# Altium footprint library Connector_art.PcbLib: 209 footprints (part 6 of 14)
Each footprint in its own frame and in the unit in brackets; x right, y up, seen from the top. Pads: shape width x height; smd on the part's side, far side on the other; paste and mask are expansions set on the pad; w line width, h text height; cw(c..) or ccw(c..) is an arc to the next point about the centre after c.
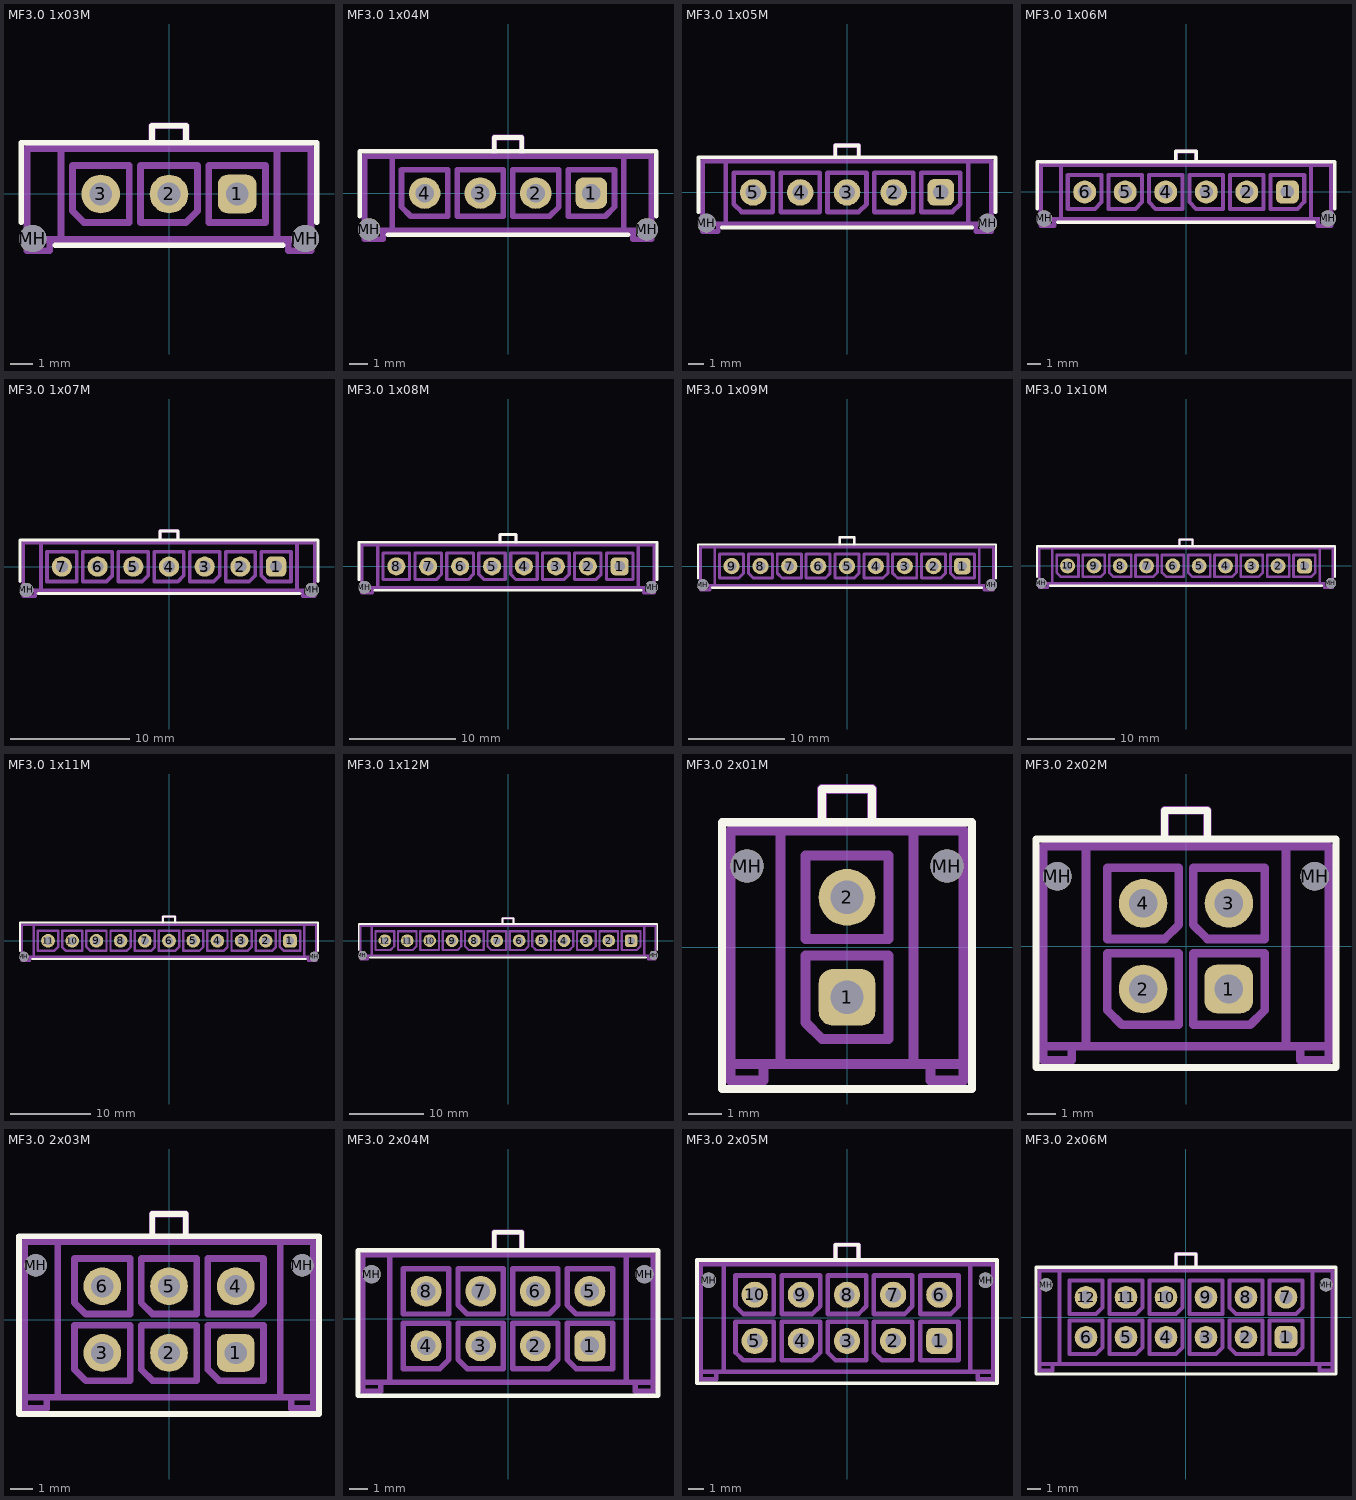
[diagram p5: the footprints below, top view; thin cyan lines are the x and y axes]

## MF3.0 1x03M [mm]
height 9.91
pads (5):
  rrect50% 1.7x1.7 hole 1 paste+0: 1(3,0)
  round 1.7 hole 1: 2(0,0) 3(-3,0)
  round 1.2 hole 1.2 unplated: MH(-6,-1.96) MH(6,-1.96)
Top Overlay:
  lines w0.25: -6.5,-1.25 -6.5,2.25 6.5,2.25 6.5,-1.25 ; -5,-2.25 5,-2.25 ; -0.75,2.25 -0.75,3 0.75,3 0.75,2.25
Mechanical 1:
  lines w0.3: -5.25,-2 -5.25,-2.5 -6.25,-2.5 ; -0.75,2 -0.75,3 0.75,3 0.75,2 ; 5.25,-2 5.25,-2.5 6.25,-2.5 ; -6.25,-2.5 -6.25,-2 -4.75,-2 ; -6.25,-2.5 -6.25,2 -4.75,2 ; -4.75,-2 4.75,-2 ; -4.75,-2 -4.75,2 ; -4.75,2 4.75,2 ; 4.75,-2 6.25,-2 6.25,-2.5 ; 4.75,-2 4.75,2 ; 4.75,2 6.25,2 6.25,-2.5 ; -4.25,-0.75 -3.75,-1.25 -1.75,-1.25 -1.75,1.25 -4.25,1.25 -4.25,-0.75 ; -1.25,-1.25 -1.25,1.25 1.25,1.25 1.25,-0.75 0.75,-1.25 -1.25,-1.25 ; 1.75,-1.25 1.75,1.25 4.25,1.25 4.25,-1.25 1.75,-1.25
3D body: height 9.91, standoff -3.17, extent -6.325,-2.47 6.325,3.1

## MF3.0 1x04M [mm]
height 9.91
pads (6):
  rrect50% 1.7x1.7 hole 1 paste+0: 1(4.5,0)
  round 1.7 hole 1: 2(1.5,0) 3(-1.5,0) 4(-4.5,0)
  round 1.2 hole 1.2 unplated: MH(-7.5,-1.96) MH(7.5,-1.96)
Top Overlay:
  lines w0.25: -8,-1.25 -8,2.25 8,2.25 8,-1.25 ; -6.5,-2.25 6.5,-2.25 ; -0.75,2.25 -0.75,3 0.75,3 0.75,2.25
Mechanical 1:
  lines w0.3: -6.75,-2 -6.75,-2.5 -7.75,-2.5 ; -0.75,2 -0.75,3 0.75,3 0.75,2 ; 6.75,-2 6.75,-2.5 7.75,-2.5 ; -7.75,-2.5 -7.75,-2 -6.25,-2 ; -7.75,-2.5 -7.75,2 -6.25,2 ; -6.25,-2 6.25,-2 ; -6.25,-2 -6.25,2 ; -6.25,2 6.25,2 ; 6.25,-2 7.75,-2 7.75,-2.5 ; 6.25,-2 6.25,2 ; 6.25,2 7.75,2 7.75,-2.5 ; -5.75,-0.75 -5.75,1.25 -3.25,1.25 -3.25,-1.25 -5.25,-1.25 -5.75,-0.75 ; -2.75,-1.25 -2.75,1.25 -0.25,1.25 -0.25,-1.25 -2.75,-1.25 ; 0.25,-1.25 2.25,-1.25 2.75,-0.75 2.75,1.25 0.25,1.25 0.25,-1.25 ; 3.25,-1.25 5.25,-1.25 5.75,-0.75 5.75,1.25 3.25,1.25 3.25,-1.25
3D body: height 9.91, standoff -3.17, extent -7.825,-2.47 7.825,3.1

## MF3.0 1x05M [mm]
height 9.91
pads (7):
  rrect50% 1.7x1.7 hole 1 paste+0: 1(6,0)
  round 1.7 hole 1: 2(3,0) 3(0,0) 4(-3,0) 5(-6,0)
  round 1.2 hole 1.2 unplated: MH(-9,-1.96) MH(9,-1.96)
Top Overlay:
  lines w0.25: -9.5,-1.25 -9.5,2.25 9.5,2.25 9.5,-1.25 ; -8,-2.25 8,-2.25 ; -0.75,2.25 -0.75,3 0.75,3 0.75,2.25
Mechanical 1:
  lines w0.3: -8.25,-2 -8.25,-2.5 -9.25,-2.5 ; -0.75,2 -0.75,3 0.75,3 0.75,2 ; 8.25,-2 8.25,-2.5 9.25,-2.5 ; -9.25,-2.5 -9.25,2 -7.75,2 ; -9.25,-2.5 -9.25,-2 -7.75,-2 ; -7.75,-2 -7.75,2 ; -7.75,-2 7.75,-2 ; -7.75,2 7.75,2 ; 7.75,-2 7.75,2 ; 7.75,-2 9.25,-2 9.25,-2.5 ; 7.75,2 9.25,2 9.25,-2.5 ; -7.25,-0.75 -6.75,-1.25 -4.75,-1.25 -4.75,1.25 -7.25,1.25 -7.25,-0.75 ; -4.25,-1.25 -4.25,1.25 -1.75,1.25 -1.75,-1.25 -4.25,-1.25 ; -1.25,-1.25 -1.25,1.25 1.25,1.25 1.25,-0.75 0.75,-1.25 -1.25,-1.25 ; 1.75,-1.25 1.75,1.25 4.25,1.25 4.25,-1.25 1.75,-1.25 ; 4.75,-1.25 4.75,1.25 7.25,1.25 7.25,-0.75 6.75,-1.25 4.75,-1.25
3D body: height 9.91, standoff -3.17, extent -9.32,-2.47 9.32,3.1

## MF3.0 1x06M [mm]
height 9.91
pads (8):
  rrect50% 1.7x1.7 hole 1 paste+0: 1(7.5,0)
  round 1.7 hole 1: 2(4.5,0) 3(1.5,0) 4(-1.5,0) 5(-4.5,0) 6(-7.5,0)
  round 1.2 hole 1.2 unplated: MH(-10.5,-1.96) MH(10.5,-1.96)
Top Overlay:
  lines w0.25: -11,-1.25 -11,2.25 11,2.25 11,-1.25 ; -9.5,-2.25 9.5,-2.25 ; -0.75,2.25 -0.75,3 0.75,3 0.75,2.25
Mechanical 1:
  lines w0.3: -9.75,-2 -9.75,-2.5 -10.75,-2.5 ; -0.75,2 -0.75,3 0.75,3 0.75,2 ; 9.75,-2 9.75,-2.5 10.75,-2.5 ; -10.75,-2.5 -10.75,-2 -9.25,-2 ; -10.75,-2.5 -10.75,2 -9.25,2 ; -9.25,-2 9.25,-2 ; -9.25,-2 -9.25,2 ; -9.25,2 9.25,2 ; 6.25,-1.25 6.25,1.25 8.75,1.25 8.75,-0.75 8.25,-1.25 6.25,-1.25 ; 6.25,-1.25 6.25,-1.25 ; 9.25,-2 10.75,-2 10.75,-2.5 ; 9.25,-2 9.25,2 ; 9.25,2 10.75,2 10.75,-2.5 ; -8.75,-1.25 -8.75,1.25 -6.25,1.25 -6.25,-0.75 -6.75,-1.25 -8.75,-1.25 ; -5.75,-1.25 -5.75,1.25 -3.25,1.25 -3.25,-0.75 -3.75,-1.25 -5.75,-1.25 ; -2.75,-0.75 -2.25,-1.25 -0.25,-1.25 -0.25,1.25 -2.75,1.25 -2.75,-0.75 ; 0.25,-0.75 0.75,-1.25 2.75,-1.25 2.75,1.25 0.25,1.25 0.25,-0.75 ; 3.25,-1.25 5.75,-1.25 5.75,1.25 3.25,1.25 3.25,-1.25
3D body: height 9.91, standoff -3.17, extent -10.82,-2.47 10.82,3.1

## MF3.0 1x07M [mm]
height 9.91
pads (9):
  rrect50% 1.7x1.7 hole 1 paste+0: 1(9,0)
  round 1.7 hole 1: 2(6,0) 3(3,0) 4(0,0) 5(-3,0) 6(-6,0) 7(-9,0)
  round 1.2 hole 1.2 unplated: MH(-12,-1.96) MH(12,-1.96)
Top Overlay:
  lines w0.25: -12.5,-1.25 -12.5,2.25 12.5,2.25 12.5,-1.25 ; -11,-2.25 11,-2.25 ; -0.75,2.25 -0.75,3 0.75,3 0.75,2.25
Mechanical 1:
  lines w0.3: -11.25,-2 -11.25,-2.5 -12.25,-2.5 ; -0.75,2 -0.75,3 0.75,3 0.75,2 ; 11.25,-2 11.25,-2.5 12.25,-2.5 ; -12.25,-2.5 -12.25,-2 -10.75,-2 ; -12.25,-2.5 -12.25,2 -10.75,2 ; -10.75,-2 10.75,-2 ; -10.75,-2 -10.75,2 ; -10.75,2 10.75,2 ; 10.75,-2 12.25,-2 12.25,-2.5 ; 10.75,-2 10.75,2 ; 10.75,2 12.25,2 12.25,-2.5 ; -10.25,-1.25 -10.25,1.25 -7.75,1.25 -7.75,-1.25 -10.25,-1.25 ; -7.25,-1.25 -7.25,1.25 -4.75,1.25 -4.75,-0.75 -5.25,-1.25 -7.25,-1.25 ; -4.25,-1.25 -4.25,1.25 -1.75,1.25 -1.75,-0.75 -2.25,-1.25 -4.25,-1.25 ; -1.25,-1.25 -1.25,1.25 1.25,1.25 1.25,-0.75 0.75,-1.25 -1.25,-1.25 ; 1.75,-1.25 1.75,1.25 4.25,1.25 4.25,-0.75 3.75,-1.25 1.75,-1.25 ; 4.75,-1.25 4.75,1.25 7.25,1.25 7.25,-0.75 6.75,-1.25 4.75,-1.25 ; 7.75,-0.75 7.75,1.25 10.25,1.25 10.25,-1.25 8.25,-1.25 7.75,-0.75
3D body: height 9.91, standoff -3.17, extent -12.32,-2.47 12.32,3.1

## MF3.0 1x08M [mm]
height 9.91
pads (10):
  rrect50% 1.7x1.7 hole 1 paste+0: 1(10.5,0)
  round 1.7 hole 1: 2(7.5,0) 3(4.5,0) 4(1.5,0) 5(-1.5,0) 6(-4.5,0) 7(-7.5,0) 8(-10.5,0)
  round 1.2 hole 1.2 unplated: MH(-13.5,-1.96) MH(13.5,-1.96)
Top Overlay:
  lines w0.25: -14,-1.25 -14,2.25 14,2.25 14,-1.25 ; -12.5,-2.25 12.5,-2.25 ; -0.75,2.25 -0.75,3 0.75,3 0.75,2.25
Mechanical 1:
  lines w0.3: -12.75,-2 -12.75,-2.5 -13.75,-2.5 ; -0.75,2 -0.75,3 0.75,3 0.75,2 ; 12.75,-2 12.75,-2.5 13.75,-2.5 ; -13.75,-2.5 -13.75,-2 -12.25,-2 ; -13.75,-2.5 -13.75,2 -12.25,2 ; -12.25,-2 12.25,-2 ; -12.25,-2 -12.25,2 ; -12.25,2 12.25,2 ; 12.25,-2 13.75,-2 13.75,-2.5 ; 12.25,-2 12.25,2 ; 12.25,2 13.75,2 13.75,-2.5 ; -11.75,-1.25 -11.75,1.25 -9.25,1.25 -9.25,-1.25 -11.75,-1.25 ; -8.75,-1.25 -6.75,-1.25 -6.25,-0.75 -6.25,1.25 -8.75,1.25 -8.75,-1.25 ; -5.75,-1.25 -3.75,-1.25 -3.25,-0.75 -3.25,1.25 -5.75,1.25 -5.75,-1.25 ; -2.75,-0.75 -2.75,1.25 -0.25,1.25 -0.25,-1.25 -2.25,-1.25 -2.75,-0.75 ; 0.25,-0.75 0.25,1.25 2.75,1.25 2.75,-1.25 0.75,-1.25 0.25,-0.75 ; 3.25,-1.25 5.25,-1.25 5.75,-0.75 5.75,1.25 3.25,1.25 3.25,-1.25 ; 6.25,-1.25 8.25,-1.25 8.75,-0.75 8.75,1.25 6.25,1.25 6.25,-1.25 ; 9.25,-1.25 9.25,1.25 11.75,1.25 11.75,-1.25 9.25,-1.25
3D body: height 9.91, standoff -3.17, extent -13.82,-2.47 13.82,3.1

## MF3.0 1x09M [mm]
height 9.91
pads (11):
  rrect50% 1.7x1.7 hole 1 paste+0: 1(12,0)
  round 1.7 hole 1: 2(9,0) 3(6,0) 4(3,0) 5(0,0) 6(-3,0) 7(-6,0) 8(-9,0) 9(-12,0)
  round 1.2 hole 1.2 unplated: MH(-15,-1.96) MH(15,-1.96)
Top Overlay:
  lines w0.25: -15.5,-1.25 -15.5,2.25 15.5,2.25 15.5,-1.25 ; -14,-2.25 14,-2.25 ; -0.75,2.25 -0.75,3 0.75,3 0.75,2.25
Mechanical 1:
  lines w0.3: -14.25,-2 -14.25,-2.5 -15.25,-2.5 ; -0.75,2 -0.75,3 0.75,3 0.75,2 ; 14.25,-2 14.25,-2.5 15.25,-2.5 ; -15.25,-2.5 -15.25,2 -13.75,2 ; -15.25,-2.5 -15.25,-2 -13.75,-2 ; -13.75,-2 -13.75,2 ; -13.75,-2 13.75,-2 ; -13.75,2 13.75,2 ; 13.75,-2 13.75,2 ; 13.75,-2 15.25,-2 15.25,-2.5 ; 13.75,2 15.25,2 15.25,-2.5 ; -13.25,-1.25 -11.25,-1.25 -10.75,-0.75 -10.75,1.25 -13.25,1.25 -13.25,-1.25 ; -10.25,-0.75 -10.25,1.25 -7.75,1.25 -7.75,-1.25 -9.75,-1.25 -10.25,-0.75 ; -7.25,-0.75 -7.25,1.25 -4.75,1.25 -4.75,-1.25 -6.75,-1.25 -7.25,-0.75 ; -4.25,-1.25 -2.25,-1.25 -1.75,-0.75 -1.75,1.25 -4.25,1.25 -4.25,-1.25 ; -1.25,-1.25 0.75,-1.25 1.25,-0.75 1.25,1.25 -1.25,1.25 -1.25,-1.25 ; 1.75,-1.25 3.75,-1.25 4.25,-0.75 4.25,1.25 1.75,1.25 1.75,-1.25 ; 4.75,-0.75 4.75,1.25 7.25,1.25 7.25,-1.25 5.25,-1.25 4.75,-0.75 ; 7.75,-1.25 9.75,-1.25 10.25,-0.75 10.25,1.25 7.75,1.25 7.75,-1.25 ; 10.75,-0.75 11.25,-1.25 13.25,-1.25 13.25,1.25 10.75,1.25 10.75,-0.75
3D body: height 9.91, standoff -3.17, extent -15.315,-2.47 15.315,3.1

## MF3.0 1x10M [mm]
height 9.91
pads (12):
  rrect50% 1.7x1.7 hole 1 paste+0: 1(13.5,0)
  round 1.7 hole 1: 2(10.5,0) 3(7.5,0) 4(4.5,0) 5(1.5,0) 6(-1.5,0) 7(-4.5,0) 8(-7.5,0) 9(-10.5,0) 10(-13.5,0)
  round 1.2 hole 1.2 unplated: MH(-16.5,-1.96) MH(16.5,-1.96)
Top Overlay:
  lines w0.25: -17,-1.25 -17,2.25 17,2.25 17,-1.25 ; -15.5,-2.25 15.5,-2.25 ; -0.75,2.25 -0.75,3 0.75,3 0.75,2.25
Mechanical 1:
  lines w0.3: -15.75,-2 -15.75,-2.5 -16.75,-2.5 ; -0.75,2 -0.75,3 0.75,3 0.75,2 ; 15.75,-2 15.75,-2.5 16.75,-2.5 ; -16.75,-2.5 -16.75,2 -15.25,2 ; -16.75,-2.5 -16.75,-2 -15.25,-2 ; -15.25,-2 -15.25,2 ; -15.25,-2 15.25,-2 ; -15.25,2 15.25,2 ; 15.25,-2 15.25,2 ; 15.25,-2 16.75,-2 16.75,-2.5 ; 15.25,2 16.75,2 16.75,-2.5 ; -14.75,-0.75 -14.25,-1.25 -12.25,-1.25 -12.25,1.25 -14.75,1.25 -14.75,-0.75 ; -11.75,-1.25 -11.75,1.25 -9.25,1.25 -9.25,-0.75 -9.75,-1.25 -11.75,-1.25 ; -8.75,-0.75 -8.25,-1.25 -6.25,-1.25 -6.25,1.25 -8.75,1.25 -8.75,-0.75 ; -5.75,-1.25 -5.75,1.25 -3.25,1.25 -3.25,-0.75 -3.75,-1.25 -5.75,-1.25 ; -2.75,-0.75 -2.25,-1.25 -0.25,-1.25 -0.25,1.25 -2.75,1.25 -2.75,-0.75 ; 0.25,-0.75 0.75,-1.25 2.75,-1.25 2.75,1.25 0.25,1.25 0.25,-0.75 ; 3.25,-1.25 3.25,1.25 5.75,1.25 5.75,-0.75 5.25,-1.25 3.25,-1.25 ; 6.25,-1.25 6.25,1.25 8.75,1.25 8.75,-0.75 8.25,-1.25 6.25,-1.25 ; 9.25,-1.25 9.25,1.25 11.75,1.25 11.75,-1.25 9.25,-1.25 ; 12.25,-1.25 12.25,1.25 14.75,1.25 14.75,-0.75 14.25,-1.25 12.25,-1.25
3D body: height 9.91, standoff -3.17, extent -16.83,-2.47 16.83,3.1

## MF3.0 1x11M [mm]
height 9.91
pads (13):
  rrect50% 1.7x1.7 hole 1 paste+0: 1(15,0)
  round 1.7 hole 1: 2(12,0) 3(9,0) 4(6,0) 5(3,0) 6(0,0) 7(-3,0) 8(-6,0) 9(-9,0) 10(-12,0) 11(-15,0)
  round 1.2 hole 1.2 unplated: MH(-18,-1.96) MH(18,-1.96)
Top Overlay:
  lines w0.25: -18.5,-1.25 -18.5,2.25 18.5,2.25 18.5,-1.25 ; -17,-2.25 17,-2.25 ; -0.75,2.25 -0.75,3 0.75,3 0.75,2.25
Mechanical 1:
  lines w0.3: -17.25,-2 -17.25,-2.5 -18.25,-2.5 ; -0.75,2 -0.75,3 0.75,3 0.75,2 ; 17.25,-2 17.25,-2.5 18.25,-2.5 ; -18.25,-2.5 -18.25,-2 -16.75,-2 ; -18.25,-2.5 -18.25,2 -16.75,2 ; -16.75,-2 16.75,-2 ; -16.75,-2 -16.75,2 ; -16.75,2 16.75,2 ; 16.75,-2 18.25,-2 18.25,-2.5 ; 16.75,-2 16.75,2 ; 16.75,2 18.25,2 18.25,-2.5 ; -16.25,-1.25 -16.25,1.25 -13.75,1.25 -13.75,-0.75 -14.25,-1.25 -16.25,-1.25 ; -13.25,-0.75 -12.75,-1.25 -10.75,-1.25 -10.75,1.25 -13.25,1.25 -13.25,-0.75 ; -10.25,-0.75 -10.25,1.25 -7.75,1.25 -7.75,-1.25 -9.75,-1.25 -10.25,-0.75 ; -7.25,-1.25 -7.25,1.25 -4.75,1.25 -4.75,-0.75 -5.25,-1.25 -7.25,-1.25 ; -4.25,-1.25 -4.25,1.25 -1.75,1.25 -1.75,-0.75 -2.25,-1.25 -4.25,-1.25 ; -1.25,-1.25 -1.25,1.25 1.25,1.25 1.25,-0.75 0.75,-1.25 -1.25,-1.25 ; 1.75,-1.25 1.75,1.25 4.25,1.25 4.25,-0.75 3.75,-1.25 1.75,-1.25 ; 4.75,-1.25 4.75,1.25 7.25,1.25 7.25,-0.75 6.75,-1.25 4.75,-1.25 ; 7.75,-1.25 7.75,1.25 10.25,1.25 10.25,-0.75 9.75,-1.25 7.75,-1.25 ; 10.75,-1.25 10.75,1.25 13.25,1.25 13.25,-0.75 12.75,-1.25 10.75,-1.25 ; 13.75,-0.75 13.75,1.25 16.25,1.25 16.25,-1.25 14.25,-1.25 13.75,-0.75
3D body: height 9.91, standoff -3.17, extent -18.325,-2.47 18.325,3.1

## MF3.0 1x12M [mm]
height 9.91
pads (14):
  rrect50% 1.7x1.7 hole 1 paste+0: 1(16.5,0)
  round 1.7 hole 1: 2(13.5,0) 3(10.5,0) 4(7.5,0) 5(4.5,0) 6(1.5,0) 7(-1.5,0) 8(-4.5,0) 9(-7.5,0) 10(-10.5,0) 11(-13.5,0) 12(-16.5,0)
  round 1.2 hole 1.2 unplated: MH(-19.5,-1.96) MH(19.5,-1.96)
Top Overlay:
  lines w0.25: -20,-1.25 -20,2.25 20,2.25 20,-1.25 ; -18.5,-2.25 18.5,-2.25 ; -0.75,2.25 -0.75,3 0.75,3 0.75,2.25
Mechanical 1:
  lines w0.3: -18.75,-2 -18.75,-2.5 -19.75,-2.5 ; -0.75,2 -0.75,3 0.75,3 0.75,2 ; 18.75,-2 18.75,-2.5 19.75,-2.5 ; -19.75,-2.5 -19.75,-2 -18.25,-2 ; -19.75,-2.5 -19.75,2 -18.25,2 ; -18.25,-2 18.25,-2 ; -18.25,-2 -18.25,2 ; -18.25,2 18.25,2 ; 18.25,-2 19.75,-2 19.75,-2.5 ; 18.25,-2 18.25,2 ; 18.25,2 19.75,2 19.75,-2.5 ; -17.75,-1.25 -15.75,-1.25 -15.25,-0.75 -15.25,1.25 -17.75,1.25 -17.75,-1.25 ; -14.75,-1.25 -12.75,-1.25 -12.25,-0.75 -12.25,1.25 -14.75,1.25 -14.75,-1.25 ; -11.75,-1.25 -9.25,-1.25 -9.25,1.25 -11.75,1.25 -11.75,-1.25 ; -8.75,-1.25 -6.75,-1.25 -6.25,-0.75 -6.25,1.25 -8.75,1.25 -8.75,-1.25 ; -5.75,-0.75 -5.75,1.25 -3.25,1.25 -3.25,-1.25 -5.25,-1.25 -5.75,-0.75 ; -2.75,-0.75 -2.75,1.25 -0.25,1.25 -0.25,-1.25 -2.25,-1.25 -2.75,-0.75 ; 0.25,-1.25 2.25,-1.25 2.75,-0.75 2.75,1.25 0.25,1.25 0.25,-1.25 ; 3.25,-0.75 3.25,1.25 5.75,1.25 5.75,-1.25 3.75,-1.25 3.25,-0.75 ; 6.25,-1.25 8.25,-1.25 8.75,-0.75 8.75,1.25 6.25,1.25 6.25,-1.25 ; 9.25,-1.25 11.25,-1.25 11.75,-0.75 11.75,1.25 9.25,1.25 9.25,-1.25 ; 12.25,-1.25 14.75,-1.25 14.75,1.25 12.25,1.25 12.25,-1.25 ; 15.25,-1.25 17.25,-1.25 17.75,-0.75 17.75,1.25 15.25,1.25 15.25,-1.25
3D body: height 9.91, standoff -3.17, extent -19.825,-2.47 19.825,3.1

## MF3.0 2x01M [mm]
height 9.91
pads (4):
  rrect50% 1.7x1.7 hole 1 paste+0: 1(0,-1.5)
  round 1.7 hole 1: 2(0,1.5)
  round 1 hole 1 unplated: MH(-3,2.44) MH(3,2.44)
Top Overlay:
  lines w0.25: -0.75,3.75 -0.75,4.75 0.75,4.75 0.75,3.75 ; -3.75,-4.25 3.75,-4.25 3.75,3.75 -3.75,3.75 -3.75,-4.25
Mechanical 1:
  lines w0.3: -2.5,-3.5 -2.5,-4 -3.5,-4 -3.5,-3.5 ; -0.75,3.5 -0.75,4.75 0.75,4.75 0.75,3.5 ; 2.5,-3.5 2.5,-4 3.5,-4 3.5,-3.5 ; -3.5,-3.5 -2,-3.5 ; -3.5,-3.5 -3.5,3.5 -2,3.5 ; -2,-3.5 3.5,-3.5 ; -2,-3.5 -2,3.5 ; -2,3.5 2,3.5 ; 2,3.5 3.5,3.5 3.5,-3.5 ; 2,3.5 2,-3.5 3.5,-3.5 ; -1.25,-2.25 -1.25,-0.25 1.25,-0.25 1.25,-2.75 -0.75,-2.75 -1.25,-2.25 ; -1.25,0.25 1.25,0.25 1.25,2.75 -1.25,2.75 -1.25,0.25
3D body: height 9.91, standoff -3.18, extent -3.575,-3.97 3.575,4.8

## MF3.0 2x02M [mm]
height 9.91
pads (6):
  rrect50% 1.7x1.7 hole 1 paste+0: 1(1.5,-1.5)
  round 1.7 hole 1: 2(-1.5,-1.5) 3(1.5,1.5) 4(-1.5,1.5)
  round 1 hole 1 unplated: MH(-4.5,2.44) MH(4.5,2.44)
Top Overlay:
  lines w0.25: -0.75,3.75 -0.75,4.75 0.75,4.75 0.75,3.75 ; -5.25,-4.25 -5.25,3.75 5.25,3.75 5.25,-4.25 -5.25,-4.25
Mechanical 1:
  lines w0.3: -4,-3.5 -4,-4 -5,-4 -5,-3.5 ; -0.75,3.5 -0.75,4.75 0.75,4.75 0.75,3.5 ; 4,-3.5 4,-4 5,-4 5,-3.5 ; -5,-3.5 -5,3.5 -3.5,3.5 ; -5,-3.5 -3.5,-3.5 ; -3.5,-3.5 -3.5,3.5 ; -3.5,-3.5 3.5,-3.5 ; -3.5,3.5 3.5,3.5 ; 3.5,-3.5 3.5,3.5 ; 3.5,-3.5 5,-3.5 ; 3.5,3.5 5,3.5 5,-3.5 ; -2.75,-2.25 -2.75,-0.25 -0.25,-0.25 -0.25,-2.75 -2.25,-2.75 -2.75,-2.25 ; -2.75,0.25 -0.75,0.25 -0.25,0.75 -0.25,2.75 -2.75,2.75 -2.75,0.25 ; 0.25,-2.75 2.25,-2.75 2.75,-2.25 2.75,-0.25 0.25,-0.25 0.25,-2.75 ; 0.25,0.75 0.75,0.25 2.75,0.25 2.75,2.75 0.25,2.75 0.25,0.75
3D body: height 9.91, standoff -3.18, extent -5.075,-3.97 5.075,4.8

## MF3.0 2x03M [mm]
height 9.91
pads (8):
  rrect50% 1.7x1.7 hole 1 paste+0: 1(3,-1.5)
  round 1.7 hole 1: 2(0,-1.5) 3(-3,-1.5) 4(3,1.5) 5(0,1.5) 6(-3,1.5)
  round 1 hole 1 unplated: MH(-6,2.44) MH(6,2.44)
Top Overlay:
  lines w0.25: -0.75,3.75 -0.75,4.75 0.75,4.75 0.75,3.75 ; -6.75,-4.25 6.75,-4.25 6.75,3.75 -6.75,3.75 -6.75,-4.25
Mechanical 1:
  lines w0.3: -5.5,-3.5 -5.5,-4 -6.5,-4 -6.5,-3.5 ; -0.75,3.5 -0.75,4.75 0.75,4.75 0.75,3.5 ; 5.5,-3.5 5.5,-4 6.5,-4 6.5,-3.5 ; -6.5,-3.5 -5,-3.5 ; -6.5,-3.5 -6.5,3.5 -5,3.5 ; -5,-3.5 5,-3.5 ; -5,-3.5 -5,3.5 ; -5,3.5 5,3.5 ; 5,-3.5 6.5,-3.5 ; 5,-3.5 5,3.5 ; 5,3.5 6.5,3.5 6.5,-3.5 ; -4.25,-2.25 -3.75,-2.75 -1.75,-2.75 -1.75,-0.25 -4.25,-0.25 -4.25,-2.25 ; -4.25,0.75 -3.75,0.25 -1.75,0.25 -1.75,2.75 -4.25,2.75 -4.25,0.75 ; -1.25,-2.25 -0.75,-2.75 1.25,-2.75 1.25,-0.25 -1.25,-0.25 -1.25,-2.25 ; -1.25,0.75 -0.75,0.25 1.25,0.25 1.25,2.75 -1.25,2.75 -1.25,0.75 ; 1.75,-2.25 2.25,-2.75 4.25,-2.75 4.25,-0.25 1.75,-0.25 1.75,-2.25 ; 1.75,0.25 1.75,2.75 4.25,2.75 4.25,0.75 3.75,0.25 1.75,0.25
3D body: height 9.91, standoff -3.18, extent -6.575,-3.97 6.575,4.8

## MF3.0 2x04M [mm]
height 9.91
pads (10):
  rrect50% 1.7x1.7 hole 1 paste+0: 1(4.5,-1.5)
  round 1.7 hole 1: 2(1.5,-1.5) 3(-1.5,-1.5) 4(-4.5,-1.5) 5(4.5,1.5) 6(1.5,1.5) 7(-1.5,1.5) 8(-4.5,1.5)
  round 1 hole 1 unplated: MH(-7.5,2.44) MH(7.5,2.44)
Top Overlay:
  lines w0.25: -0.75,3.75 -0.75,4.75 0.75,4.75 0.75,3.75 ; -8.25,-4.25 8.25,-4.25 8.25,3.75 -8.25,3.75 -8.25,-4.25
Mechanical 1:
  lines w0.3: -7,-3.5 -7,-4 -8,-4 -8,-3.5 ; -0.75,3.5 -0.75,4.75 0.75,4.75 0.75,3.5 ; 7,-3.5 7,-4 8,-4 8,-3.5 ; -8,-3.5 -6.5,-3.5 ; -8,-3.5 -8,3.5 -6.5,3.5 ; -6.5,-3.5 6.5,-3.5 ; -6.5,-3.5 -6.5,3.5 ; -6.5,3.5 6.5,3.5 ; 6.5,-3.5 8,-3.5 ; 6.5,-3.5 6.5,3.5 ; 6.5,3.5 8,3.5 8,-3.5 ; -5.75,-2.75 -3.75,-2.75 -3.25,-2.25 -3.25,-0.25 -5.75,-0.25 -5.75,-2.75 ; -5.75,0.25 -3.25,0.25 -3.25,2.75 -5.75,2.75 -5.75,0.25 ; -2.75,-2.25 -2.25,-2.75 -0.25,-2.75 -0.25,-0.25 -2.75,-0.25 -2.75,-2.25 ; -2.75,0.75 -2.75,2.75 -0.25,2.75 -0.25,0.25 -2.25,0.25 -2.75,0.75 ; 0.25,-2.75 0.25,-0.25 2.75,-0.25 2.75,-2.25 2.25,-2.75 0.25,-2.75 ; 0.25,0.25 2.25,0.25 2.75,0.75 2.75,2.75 0.25,2.75 0.25,0.25 ; 3.25,-2.25 3.25,-0.25 5.75,-0.25 5.75,-2.75 3.75,-2.75 3.25,-2.25 ; 3.25,0.75 3.75,0.25 5.75,0.25 5.75,2.75 3.25,2.75 3.25,0.75
3D body: height 9.91, standoff -3.18, extent -8.075,-3.97 8.075,4.8

## MF3.0 2x05M [mm]
height 9.91
pads (12):
  rrect50% 1.7x1.7 hole 1 paste+0: 1(6,-1.5)
  round 1.7 hole 1: 2(3,-1.5) 3(0,-1.5) 4(-3,-1.5) 5(-6,-1.5) 6(6,1.5) 7(3,1.5) 8(0,1.5) 9(-3,1.5) 10(-6,1.5)
  round 1 hole 1 unplated: MH(-9,2.44) MH(9,2.44)
Top Overlay:
  lines w0.25: -0.75,3.75 -0.75,4.75 0.75,4.75 0.75,3.75 ; -9.75,-4.25 9.75,-4.25 9.75,3.75 -9.75,3.75 -9.75,-4.25
Mechanical 1:
  lines w0.3: -8.5,-3.5 -8.5,-4 -9.5,-4 -9.5,-3.5 ; -0.75,3.5 -0.75,4.75 0.75,4.75 0.75,3.5 ; 8.5,-3.5 8.5,-4 9.5,-4 9.5,-3.5 ; -9.5,-3.5 -8,-3.5 ; -9.5,-3.5 -9.5,3.5 -8,3.5 ; -8,-3.5 8,-3.5 ; -8,-3.5 -8,3.5 ; -8,3.5 8,3.5 ; 8,-3.5 9.5,-3.5 ; 8,-3.5 8,3.5 ; 8,3.5 9.5,3.5 9.5,-3.5 ; -7.25,-2.25 -7.25,-0.25 -4.75,-0.25 -4.75,-2.75 -6.75,-2.75 -7.25,-2.25 ; -7.25,0.75 -6.75,0.25 -4.75,0.25 -4.75,2.75 -7.25,2.75 -7.25,0.75 ; -4.25,-2.75 -2.25,-2.75 -1.75,-2.25 -1.75,-0.25 -4.25,-0.25 -4.25,-2.75 ; -4.25,0.25 -2.25,0.25 -1.75,0.75 -1.75,2.75 -4.25,2.75 -4.25,0.25 ; -1.25,-2.25 -1.25,-0.25 1.25,-0.25 1.25,-2.75 -0.75,-2.75 -1.25,-2.25 ; -1.25,0.25 0.75,0.25 1.25,0.75 1.25,2.75 -1.25,2.75 -1.25,0.25 ; 1.75,-2.25 1.75,-0.25 4.25,-0.25 4.25,-2.75 2.25,-2.75 1.75,-2.25 ; 1.75,0.25 3.75,0.25 4.25,0.75 4.25,2.75 1.75,2.75 1.75,0.25 ; 4.75,-2.75 4.75,-0.25 7.25,-0.25 7.25,-2.75 4.75,-2.75 ; 4.75,0.25 6.75,0.25 7.25,0.75 7.25,2.75 4.75,2.75 4.75,0.25
3D body: height 9.91, standoff -3.18, extent -9.575,-3.97 9.575,4.8

## MF3.0 2x06M [mm]
height 9.91
pads (14):
  rrect50% 1.7x1.7 hole 1 paste+0: 1(7.5,-1.5)
  round 1.7 hole 1: 2(4.5,-1.5) 3(1.5,-1.5) 4(-1.5,-1.5) 5(-4.5,-1.5) 6(-7.5,-1.5) 7(7.5,1.5) 8(4.5,1.5) 9(1.5,1.5) 10(-1.5,1.5) 11(-4.5,1.5) 12(-7.5,1.5)
  round 1 hole 1 unplated: MH(-10.5,2.44) MH(10.5,2.44)
Top Overlay:
  lines w0.25: -0.75,3.75 -0.75,4.75 0.75,4.75 0.75,3.75 ; -11.25,-4.25 11.25,-4.25 11.25,3.75 -11.25,3.75 -11.25,-4.25
Mechanical 1:
  lines w0.3: -10,-3.5 -10,-4 -11,-4 -11,-3.5 ; -0.75,3.5 -0.75,4.75 0.75,4.75 0.75,3.5 ; 10,-3.5 10,-4 11,-4 11,-3.5 ; -11,-3.5 -9.5,-3.5 ; -11,-3.5 -11,3.5 -9.5,3.5 ; -9.5,-3.5 9.5,-3.5 ; -9.5,-3.5 -9.5,3.5 ; -9.5,3.5 9.5,3.5 ; 9.5,-3.5 11,-3.5 ; 9.5,-3.5 9.5,3.5 ; 9.5,3.5 11,3.5 11,-3.5 ; -8.75,-2.75 -6.75,-2.75 -6.25,-2.25 -6.25,-0.25 -8.75,-0.25 -8.75,-2.75 ; -8.75,0.25 -6.75,0.25 -6.25,0.75 -6.25,2.75 -8.75,2.75 -8.75,0.25 ; -5.75,-2.75 -3.75,-2.75 -3.25,-2.25 -3.25,-0.25 -5.75,-0.25 -5.75,-2.75 ; -5.75,0.25 -3.75,0.25 -3.25,0.75 -3.25,2.75 -5.75,2.75 -5.75,0.25 ; -2.75,-2.75 -0.75,-2.75 -0.25,-2.25 -0.25,-0.25 -2.75,-0.25 -2.75,-2.75 ; -2.75,0.25 -0.75,0.25 -0.25,0.75 -0.25,2.75 -2.75,2.75 -2.75,0.25 ; 0.25,-2.75 0.25,-0.25 2.75,-0.25 2.75,-2.25 2.25,-2.75 0.25,-2.75 ; 0.25,0.25 0.25,2.75 2.75,2.75 2.75,0.25 0.25,0.25 ; 3.25,-2.25 3.25,-0.25 5.75,-0.25 5.75,-2.75 3.75,-2.75 3.25,-2.25 ; 3.25,0.75 3.75,0.25 5.75,0.25 5.75,2.75 3.25,2.75 3.25,0.75 ; 6.25,-2.75 8.25,-2.75 8.75,-2.25 8.75,-0.25 6.25,-0.25 6.25,-2.75 ; 6.25,0.25 8.25,0.25 8.75,0.75 8.75,2.75 6.25,2.75 6.25,0.25
3D body: height 9.91, standoff -3.18, extent -11.075,-3.97 11.075,4.8